# Altium footprint library GRID.PcbLib: 54 footprints (part 1 of 4)
Each footprint in its own frame and in the unit in brackets; x right, y up, seen from the top. Pads: shape width x height; smd on the part's side, far side on the other; paste and mask are expansions set on the pad; w line width, h text height; cw(c..) or ccw(c..) is an arc to the next point about the centre after c.
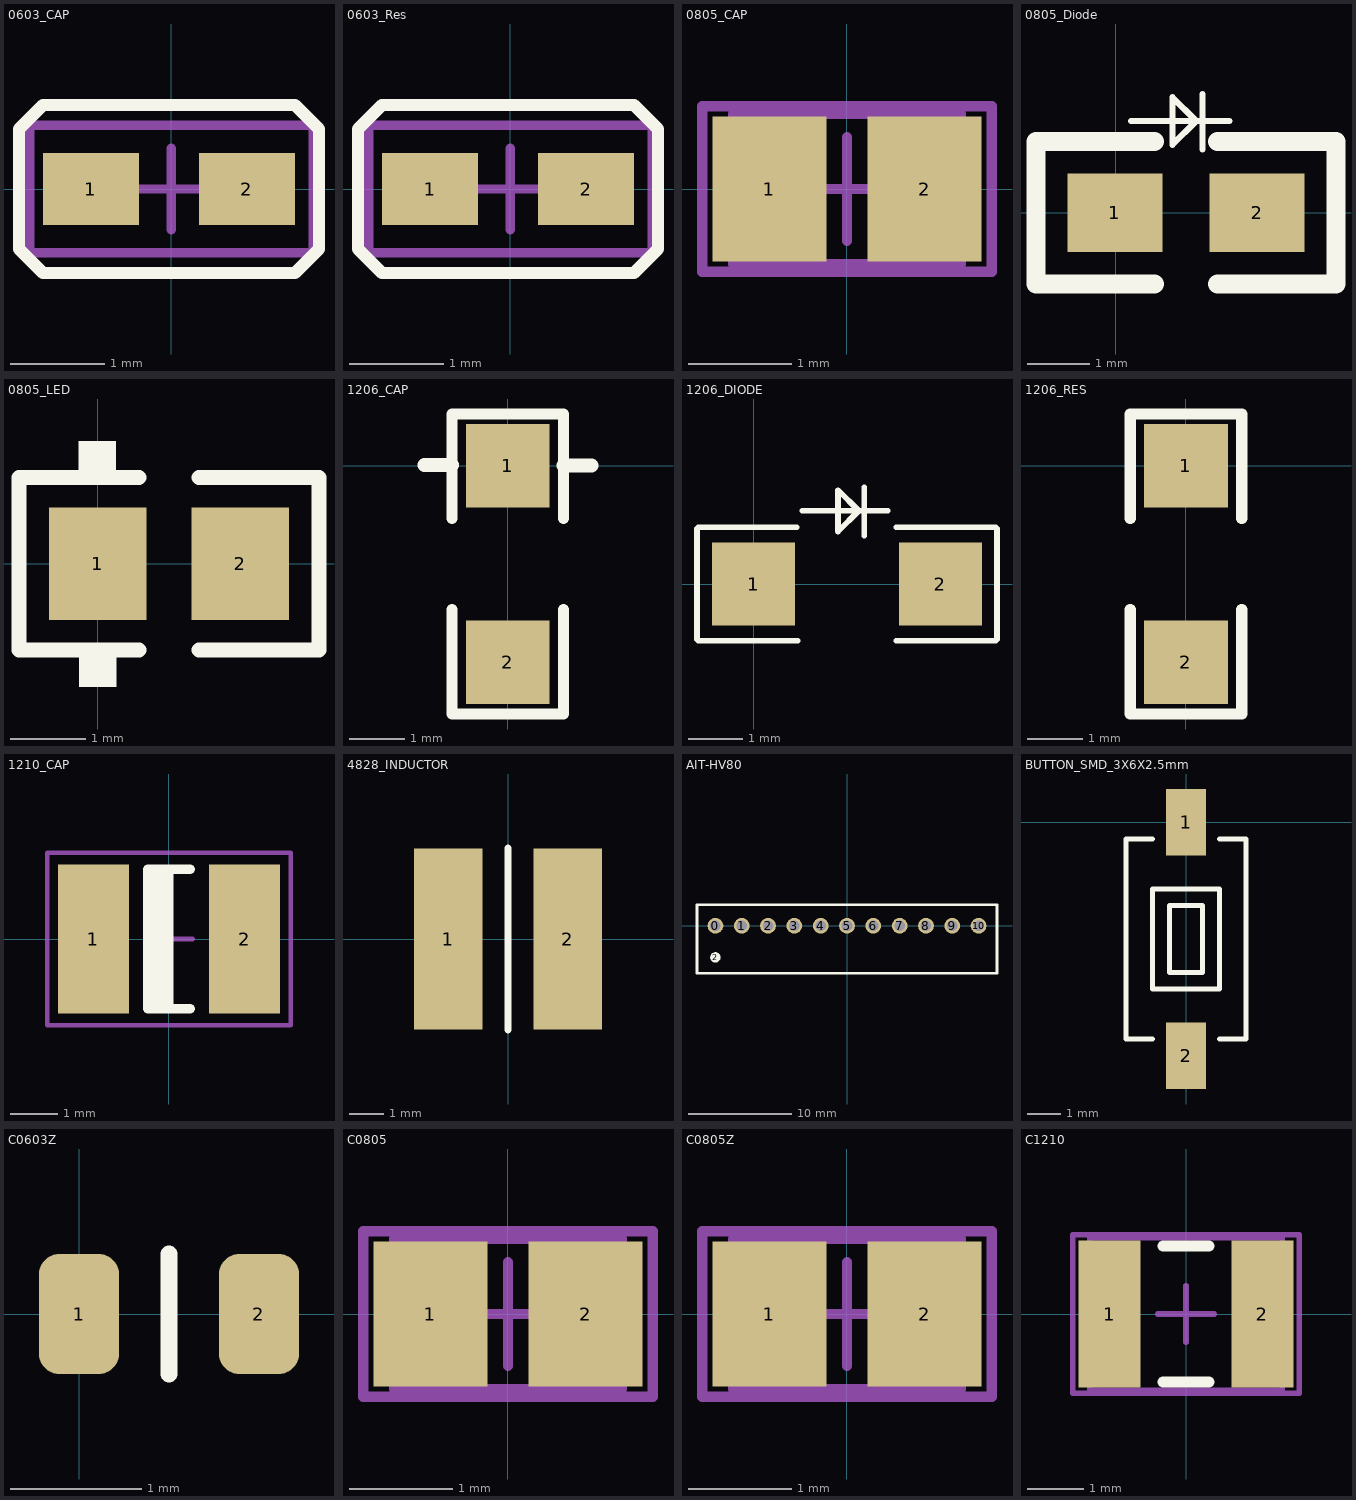
[diagram p0: the footprints below, top view; thin cyan lines are the x and y axes]

## 0603_CAP [mil]
height 225.2
pads (2):
  rect 40x30 smd: 1(-33.46,0) 2(31.54,0)
Top Overlay:
  lines w5: -63.46,-25 -53.46,-35 51.54,-35 61.54,-25 61.54,25 51.54,35 -53.46,35 -63.46,25 -63.46,-25
Mechanical 15:
  lines w3.94: -59.05,-26.57 59.06,-26.57 ; -59.05,-26.57 -59.05,26.57 ; -59.06,-26.57 59.06,-26.57 ; -59.06,-26.57 -59.06,26.57 ; -59.05,26.57 59.06,26.57 ; -59.06,26.57 59.06,26.57 ; 59.06,-26.57 59.06,26.57 ; 59.06,-26.57 59.06,26.57 ; -16.93,0 16.93,0 -16.93,0 ; 0,-16.93 0,16.93 0,-16.93
3D body "User Library-CAPC1608X09.step": height 35.43, standoff 0, extent -31.5,-15 31.5,16.5

## 0603_Res [mil] "0603_Res"
height 225.2
pads (2):
  rect 40x30 smd: 1(-33.47,0) 2(31.54,0)
Top Overlay:
  lines w5: -63.47,-25 -63.47,25 -53.47,35 51.53,35 61.53,25 61.53,-25 51.53,-35 -53.47,-35 -63.47,-25
Mechanical 15:
  lines w3.94: -16.93,0 16.93,0 ; 0,-16.93 0,16.93 ; -59.06,-26.57 -59.06,26.57 59.06,26.57 59.06,-26.57 -59.06,-26.57
3D body "User Library-RESC1608X05N.step": height 17.76, standoff 0, extent -30,-15 31.02,18.46

## 0805_CAP [mm] "Chip Capacitor, Body 2.0x1.3mm, IPC High Density"
height 1.4
pads (2):
  rect 1.1x1.4 smd: 1(-0.75,0) 2(0.75,0)
Mechanical 13:
  lines w0.1: -1.1,-0.725 1.1,-0.725 1.1,0.725 -1.1,0.725 -1.1,-0.725
Mechanical 15:
  lines w0.1: -0.5,0 0.5,0 ; 0,-0.5 0,0.5 ; -1.4,-0.8 1.4,-0.8 1.4,0.8 -1.4,0.8 -1.4,-0.8
3D body: height 1.4, standoff 0, extent -1.1,-0.725 1.1,0.725

## 0805_Diode [mil]
pads (2):
  rect 60x50 smd: 1(-0.41,-0.07) 2(89.59,-0.07)
Top Overlay:
  lines w4: 10,58 72,58 ; 55,40 55,75 ; 36,43 36,73 51,58 36,43
  lines w12: 24.59,-45.07 -50.41,-45.07 -50.41,44.93 24.59,44.93 ; 64.59,-45.07 139.59,-45.07 139.59,44.93 64.59,44.93
3D body "User Library-SOD80C-1.STEP": height 62.99, standoff 0, extent -27.87,-31.49 117.8,31.5

## 0805_LED [mm] "0805_LED"
height 5.72
pads (2):
  rect 1.3x1.5 smd: 1(0,0) 2(1.9,0)
Top Overlay:
  rectangle: -0.25,-1.644 0.25,-1.244
  rectangle: -0.256,1.24 0.244,1.64
  lines w0.2: 0.55,-1.15 -1.05,-1.15 -1.05,1.15 -0.65,1.15 0.15,1.15 0.55,1.15 ; 1.35,-1.15 2.95,-1.15 2.95,1.15 1.35,1.15
3D body "User Library-led_0805 R.STEP": height 1.1, standoff 0, extent 0.006,-0.625 2.026,0.625

## 1206_CAP [mil]
height 78.74
pads (2):
  rect 60x60 smd: 1(0,0) 2(0,-141)
Top Overlay:
  lines w8: -40,-103 -40,-178 40,-178 40,-103 ; -40,-38 -40,37 40,37 40,-38
  lines w10: -59.61,0.39 -40,0.39 ; 40,0 60,0
3D body "SW3dPS-1206 SMD Capacitor.STEP": height 39.45, standoff 0, extent -31.5,-132.99 31.49,-7.01

## 1206_DIODE [mil] "1206_Diode"
pads (2):
  rect 60x60 smd: 1(0,0) 2(135,0)
Top Overlay:
  lines w4: -41,-40 -41,40 ; -40,-41 32,-41 ; -40,41 31,41 ; 35,53 97,53 ; 80,35 80,70 ; 103,-41 175,-41 ; 103,41 175,41 ; 176,-40 176,40 ; 61,38 61,68 76,53 61,38
3D body "User Library-SOD-123_DiodesInc.STEP": height 56.42, standoff -0.67, extent -10.79,-34 140.79,32.93

## 1206_RES [mil]
height 78.74
pads (2):
  rect 60x60 smd: 1(0,0) 2(0,-141)
Top Overlay:
  lines w8: -40,-103 -40,-178 40,-178 40,-103 ; -40,-38 -40,37 40,37 40,-38
3D body "User Library-res1206.STEP": height 24.79, standoff 0, extent -35.87,-152.68 35,12.68

## 1210_CAP [mm]
height 5.72
pads (2):
  rect 1.5x3.15 smd: 1(-1.6,0) 2(1.6,0)
Top Overlay:
  rectangle: -0.45,-1.475 0.1,1.475
  lines w0.2: 0.45,-1.475 -0.45,-1.475 -0.45,1.475 0.45,1.475
Mechanical 15:
  lines w0.1: -0.5,0 0.5,0 ; 0,-0.5 0,0.5 ; -2.575,-1.825 -2.575,1.825 2.575,1.825 2.575,-1.825 -2.575,-1.825
3D body "User Library-AVX_BCASE.step": height 2.03, standoff 0, extent -1.85,-1.524 1.85,1.406

## 4828_INDUCTOR [mm]
pads (2):
  rect 2x5.3 smd: 1(-1.75,0) 2(1.75,0)
Top Overlay:
  lines w0.203: 0,-2.667 0,0 0,2.667
3D body "User Library-4532-1.STEP": height 3.25, standoff 0, extent -2.245,-1.968 2.245,2.032

## AIT-HV80 [mil]
pads (12):
  round 60 hole 40 mask+3: 0(-500,0) 1(-400,0) 2(-300,0) 3(-200,0) 4(-100,0) 5(0,0) 6(100,0) 7(200,0) 8(300,0) 9(400,0) 10(500,0)
  round 40 on Top Overlay: 2(-500,-120)
Top Overlay:
  lines w10: -570,-180 570,-180 570,80 -570,80 -570,-180

## BUTTON_SMD_3X6X2.5mm [mm]
pads (2):
  rect 1.2x2 smd: 1(0,0) 2(0,-7)
Top Overlay:
  lines w0.15: -1,-6.5 -1.8,-6.5 -1.8,-0.5 -1,-0.5 ; 1,-6.5 1.8,-6.5 1.8,-0.5 1,-0.5 ; -1,-5 -1,-2 1,-2 1,-5 -1,-5 ; -0.5,-4.5 -0.5,-2.5 0.5,-2.5 0.5,-4.5 -0.5,-4.5

## C0603Z [mil]
pads (2):
  rrect50% 24x36 smd: 1(0,0) 2(54,0)
Top Overlay:
  lines w5: 27,-18 27,18
3D body "CAPC1608X55N EIA 0603.step": height 21.65, standoff 0, extent -4.49,-15.74 58.5,15.75

## C0805 [mm] "Chip Capacitor, Body 2.0x1.3mm, IPC High Density"
height 1.4
pads (2):
  rect 1.1x1.4 smd: 1(-0.75,0) 2(0.75,0)
Mechanical 13:
  lines w0.1: -1.1,-0.725 -1.1,0.725 1.1,0.725 1.1,-0.725 -1.1,-0.725
Mechanical 15:
  lines w0.1: -0.5,0 0.5,0 ; 0,-0.5 0,0.5 ; -1.4,-0.8 -1.4,0.8 1.4,0.8 1.4,-0.8 -1.4,-0.8
3D body: height 1.4, standoff 0, extent -1.1,-0.725 1.1,0.725

## C0805Z [mm] "Chip Capacitor, Body 2.0x1.3mm, IPC High Density"
height 1.4
pads (2):
  rect 1.1x1.4 smd: 1(-0.75,0) 2(0.75,0)
Mechanical 13:
  lines w0.1: -1.1,-0.725 1.1,-0.725 1.1,0.725 -1.1,0.725 -1.1,-0.725
Mechanical 15:
  lines w0.1: -0.5,0 0.5,0 ; 0,-0.5 0,0.5 ; -1.4,-0.8 1.4,-0.8 1.4,0.8 -1.4,0.8 -1.4,-0.8
3D body: height 1.4, standoff 0, extent -1.1,-0.725 1.1,0.725

## C1210 [mm] "Chip Capacitor, Body 3.2x2.5mm, IPC High Density"
height 1.3
pads (2):
  rect 1.1x2.6 smd: 1(-1.35,0) 2(1.35,0)
Top Overlay:
  lines w0.2: -0.4,-1.2 0.4,-1.2 ; -0.4,1.2 0.4,1.2
Mechanical 13:
  lines w0.1: -1.7,-1.35 1.7,-1.35 1.7,1.35 -1.7,1.35 -1.7,-1.35
Mechanical 15:
  lines w0.1: -0.5,0 0.5,0 ; 0,-0.5 0,0.5 ; -2,-1.4 2,-1.4 2,1.4 -2,1.4 -2,-1.4
3D body: height 1.3, standoff 0, extent -1.7,-1.35 1.7,1.35